# Altium footprint library goldpin_pcb.PcbLib: 235 footprints (part 8 of 15)
Each footprint in its own frame and in the unit in brackets; x right, y up, seen from the top. Pads: shape width x height; smd on the part's side, far side on the other; paste and mask are expansions set on the pad; w line width, h text height; cw(c..) or ccw(c..) is an arc to the next point about the centre after c.
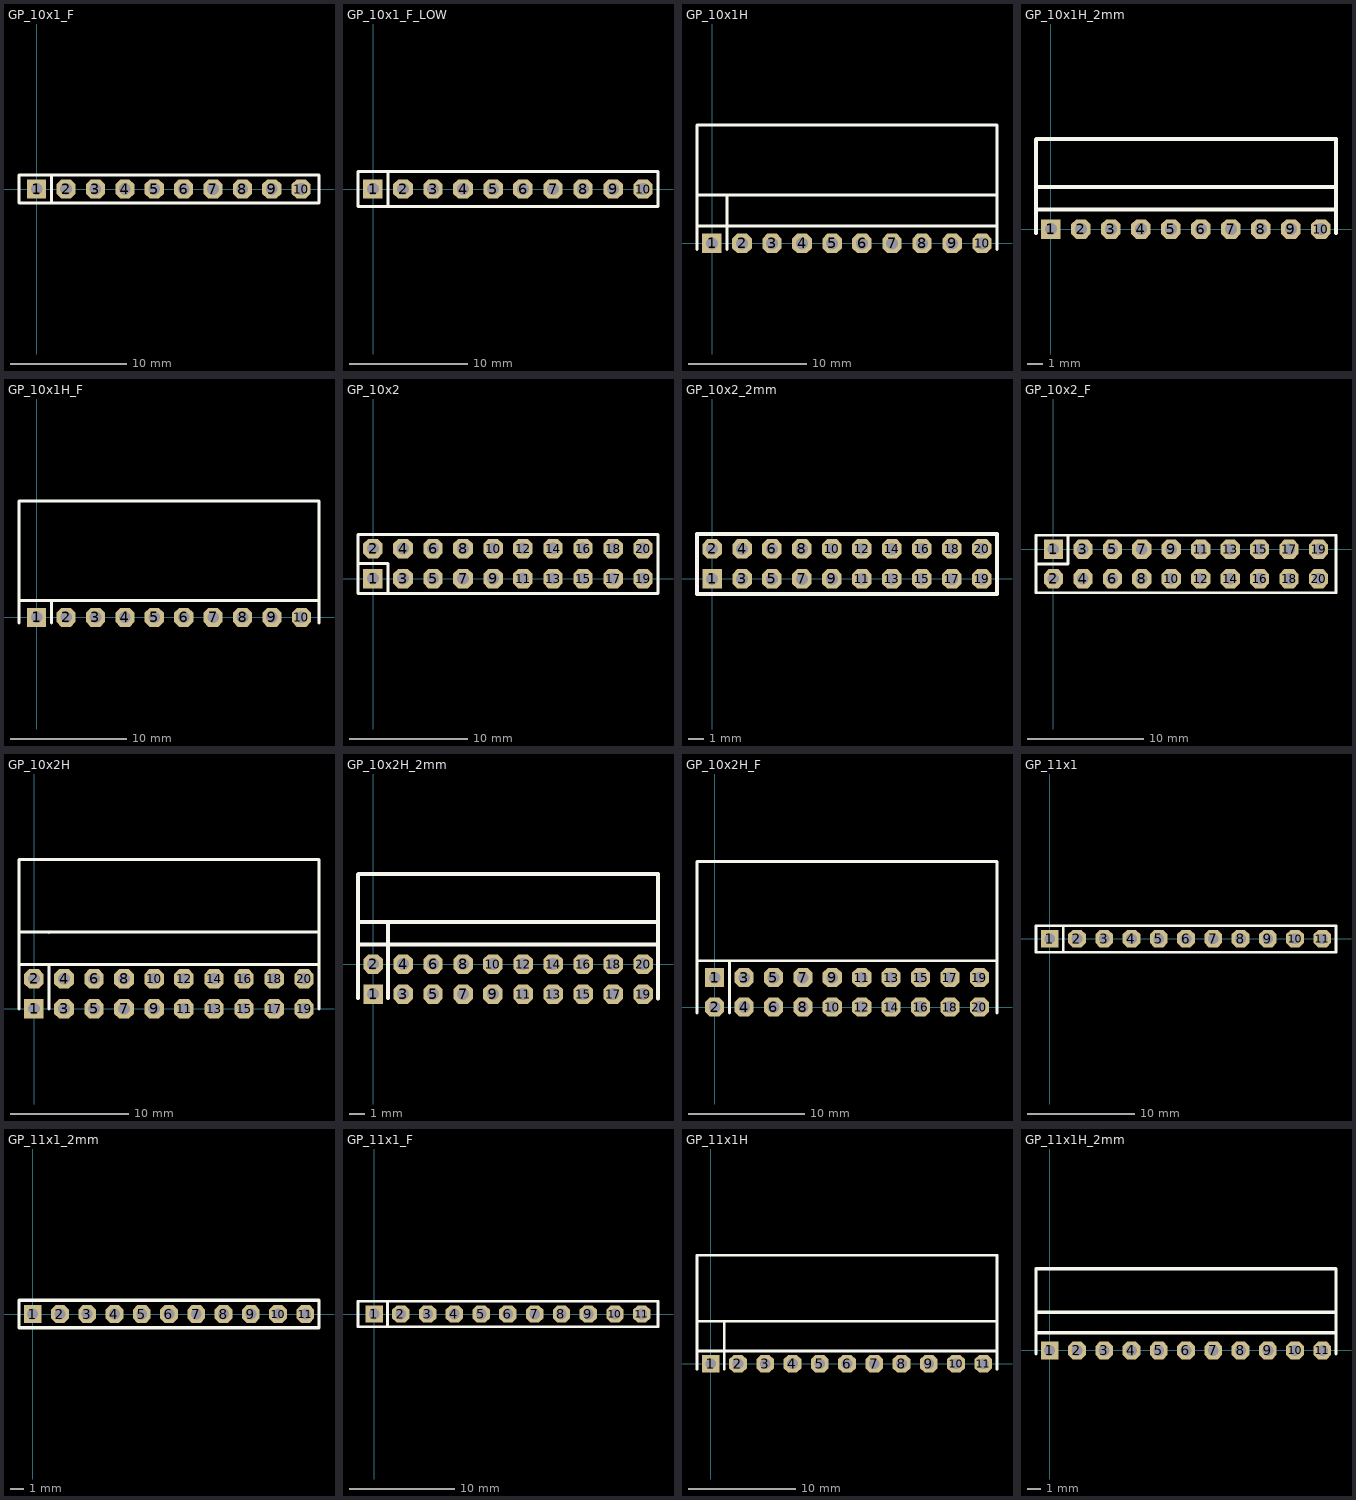
[diagram p7: the footprints below, top view; thin cyan lines are the x and y axes]

## GP_10x1_F [mil]
pads (10):
  rect 65x65 hole 39.37: 1(0,0)
  oct 65x65 hole 39.37: 2(100,0) 3(200,0) 4(300,0) 5(400,0) 6(500,0) 7(600,0) 8(700,0) 9(800,0) 10(900,0)
Top Overlay:
  lines w10: 50,-47.24 50,45 ; -60,-47.24 960.63,-47.24 960.63,47.24 -60,47.24 -60,-47.24
3D body: height 335, standoff -104, extent -60,-47.49 960,47.51

## GP_10x1_F_LOW [mil]
pads (10):
  rect 65x65 hole 39.37: 1(0,0)
  oct 65x65 hole 39.37: 2(100,0) 3(200,0) 4(300,0) 5(400,0) 6(500,0) 7(600,0) 8(700,0) 9(800,0) 10(900,0)
Top Overlay:
  lines w10: 50,-59.06 50,59.06 ; -50,-59.06 950,-59.06 950,59.06 -50,59.06 -50,-59.06
3D body: height 200.79, standoff -127.21, extent -51.18,-61.97 948.82,58.03

## GP_10x1H [mil]
pads (10):
  rect 65x65 hole 39.37: 1(0,0)
  oct 65x65 hole 39.37: 2(100,0) 3(200,0) 4(300,0) 5(400,0) 6(500,0) 7(600,0) 8(700,0) 9(800,0) 10(900,0)
Top Overlay:
  lines w10: -50,-19.68 -50,80.31 -50,395 950,395 950,-19.68 ; -50,57.24 950,57.24 ; -50,160.51 950,160.51 ; 50,-19.68 50,80.31 50,160.51
3D body: height 120, standoff -90, extent -50,-10 950,392.5

## GP_10x1H_2mm [mm]
height 4.45
pads (10):
  rect 1.3x1.3 hole 0.8: 1(0,0)
  oct 1.3x1.3 hole 0.8: 2(2,0) 3(4,0) 4(6,0) 5(8,0) 6(10,0) 7(12,0) 8(14,0) 9(16,0) 10(18,0)
Top Overlay:
  lines w0.254: -1,-0.25 -1,1.822 -1,5.973 ; -1,1.3 19,1.3 ; -1,2.8 19,2.8
  lines w0.256: -1,5.973 -0.973,6 19,6 19,-0.25
3D body: height 1.99, standoff -3.04, extent -1,-0.25 19,5.973

## GP_10x1H_F [mil]
pads (10):
  rect 65x65 hole 39.37: 1(0,0)
  oct 65x65 hole 39.37: 2(100,0) 3(200,0) 4(300,0) 5(400,0) 6(500,0) 7(600,0) 8(700,0) 9(800,0) 10(900,0)
Top Overlay:
  lines w10: -60,-20 -60,395 960,395 960,-20 ; -60,57.24 960,57.24 ; 50,-19.68 50,57.24
3D body: height 96.71, standoff -98.29, extent -60,-10 960,393

## GP_10x2 [mil]
pads (20):
  rect 65x65 hole 39.37: 1(0,0)
  oct 65x65 hole 39.37: 2(0,100) 3(100,0) 4(100,100) 5(200,0) 6(200,100) 7(300,0) 8(300,100) 9(400,0) 10(400,100) 11(500,0) 12(500,100) 13(600,0) 14(600,100) 15(700,0) 16(700,100) 17(800,0) 18(800,100) 19(900,0) 20(900,100)
Top Overlay:
  lines w10: -50,50 50,50 50,-50 ; -50,-50 950,-50 950,147.24 -50,147.24 -50,-50
3D body: height 330, standoff -115, extent -50,-50 950,150

## GP_10x2_2mm [mm]
height 4.45
pads (20):
  rect 1.3x1.3 hole 0.8: 1(0,0)
  oct 1.3x1.3 hole 0.8: 2(0,2) 3(2,0) 4(2,2) 5(4,0) 6(4,2) 7(6,0) 8(6,2) 9(8,0) 10(8,2) 11(10,0) 12(10,2) 13(12,0) 14(12,2) 15(14,0) 16(14,2) 17(16,0) 18(16,2) 19(18,0) 20(18,2)
Top Overlay:
  lines w0.254: -1,-1 -1,2.999 19,2.999 19,-1 -1,-1
3D body: height 6.51, standoff -1.69, extent -1,-0.968 19,2.969

## GP_10x2_F [mil]
pads (20):
  rect 65x65 hole 39.37: 1(0,0)
  oct 65x65 hole 39.37: 2(0,-100) 3(100,0) 4(100,-100) 5(200,0) 6(200,-100) 7(300,0) 8(300,-100) 9(400,0) 10(400,-100) 11(500,0) 12(500,-100) 13(600,0) 14(600,-100) 15(700,0) 16(700,-100) 17(800,0) 18(800,-100) 19(900,0) 20(900,-100)
Top Overlay:
  lines w10: -59.06,-50 50,-50 50,47.51 ; -59.06,-147.49 959.06,-147.49 959.06,47.49 -59.06,47.51 -59.06,-147.49
3D body: height 335, standoff -104, extent -60,-147.49 960,47.51

## GP_10x2H [mil]
pads (20):
  rect 65x65 hole 39.37: 1(0,0)
  oct 65x65 hole 39.37: 2(0,100) 3(100,0) 4(100,100) 5(200,0) 6(200,100) 7(300,0) 8(300,100) 9(400,0) 10(400,100) 11(500,0) 12(500,100) 13(600,0) 14(600,100) 15(700,0) 16(700,100) 17(800,0) 18(800,100) 19(900,0) 20(900,100)
Top Overlay:
  lines w10: -50,0 -50,180.31 -50,497.64 950,497.64 950,0 ; -50,147.24 950,147.24 ; -50,255.51 950,255.51 ; 49.21,255.51 50,254.72 ; 50,0 50,147.24
3D body: height 220, standoff -90, extent -50,-10 950,492.5

## GP_10x2H_2mm [mm]
height 4.45
pads (20):
  rect 1.3x1.3 hole 0.8: 1(0,-2)
  oct 1.3x1.3 hole 0.8: 2(0,0) 3(2,-2) 4(2,0) 5(4,-2) 6(4,0) 7(6,-2) 8(6,0) 9(8,-2) 10(8,0) 11(10,-2) 12(10,0) 13(12,-2) 14(12,0) 15(14,-2) 16(14,0) 17(16,-2) 18(16,0) 19(18,-2) 20(18,0)
Top Overlay:
  lines w0.254: -1,-2.275 -1,1.822 -1,5.973 ; -1,1.3 19,1.3 ; -1,2.8 19,2.8 ; 0.99,-2.275 0.99,2.775 ; 19,-2.3 19,6
  lines w0.256: -1,5.973 -0.973,6 19,6
3D body: height 3.97, standoff -3.02, extent -1.025,-2.261 18.975,5.961

## GP_10x2H_F [mil]
pads (20):
  rect 65x65 hole 39.37: 1(0,100)
  oct 65x65 hole 39.37: 2(0,0) 3(100,100) 4(100,0) 5(200,100) 6(200,0) 7(300,100) 8(300,0) 9(400,100) 10(400,0) 11(500,100) 12(500,0) 13(600,100) 14(600,0) 15(700,100) 16(700,0) 17(800,100) 18(800,0) 19(900,100) 20(900,0)
Top Overlay:
  lines w10: -60,-20 -60,495 960,495 960,-20 ; -60,157.24 960,157.24 ; 50,-20 50,157.24
3D body: height 197.89, standoff -97.11, extent -59.06,-11.81 960.94,491.19

## GP_11x1 [mil]
pads (11):
  rect 65x65 hole 39.37: 1(0,0)
  oct 65x65 hole 39.37: 2(100,0) 3(200,0) 4(300,0) 5(400,0) 6(500,0) 7(600,0) 8(700,0) 9(800,0) 10(900,0) 11(1000,0)
Top Overlay:
  lines w10: 50,-50 50,47.24 ; -50,-50 -50,47.24 1050,47.24 1050,-50 -50,-50
3D body: height 330, standoff -115, extent -50,-50 1050,50

## GP_11x1_2mm [mm]
height 4.45
pads (11):
  rect 1.3x1.3 hole 0.8: 1(0,0)
  oct 1.3x1.3 hole 0.8: 2(2,0) 3(4,0) 4(6,0) 5(8,0) 6(10,0) 7(12,0) 8(14,0) 9(16,0) 10(18,0) 11(20,0)
Top Overlay:
  lines w0.254: -1,-1 21,-1 21,1 -1,1 -1,-1
3D body: height 5.51, standoff -2.69, extent -1,-0.99 21,0.991

## GP_11x1_F [mil]
pads (11):
  rect 65x65 hole 39.37: 1(0,0)
  oct 65x65 hole 39.37: 2(100,0) 3(200,0) 4(300,0) 5(400,0) 6(500,0) 7(600,0) 8(700,0) 9(800,0) 10(900,0) 11(1000,0)
Top Overlay:
  lines w10: 50,-47.24 50,45 ; -60,-47.24 -60,47.24 1060.63,47.24 1060.63,-47.24 -60,-47.24
3D body: height 335, standoff -104, extent -60,-47.5 1060,47.5

## GP_11x1H [mil]
pads (11):
  rect 65x65 hole 39.37: 1(0,0)
  oct 65x65 hole 39.37: 2(100,0) 3(200,0) 4(300,0) 5(400,0) 6(500,0) 7(600,0) 8(700,0) 9(800,0) 10(900,0) 11(1000,0)
Top Overlay:
  lines w10: -50,-19.68 -50,80.31 -50,397.64 1050,397.64 1050,-19.68 ; -50,47.24 1050,47.24 ; -50,155.51 1050,155.51 ; 49.21,155.51 50,154.72 50,80.31 50,-19.68
3D body: height 120, standoff -90, extent -50,-10 1050,392.5

## GP_11x1H_2mm [mm]
height 4.45
pads (11):
  rect 1.3x1.3 hole 0.8: 1(0,0)
  oct 1.3x1.3 hole 0.8: 2(2,0) 3(4,0) 4(6,0) 5(8,0) 6(10,0) 7(12,0) 8(14,0) 9(16,0) 10(18,0) 11(20,0)
Top Overlay:
  lines w0.254: -1,-0.25 -1,1.822 -1,5.973 ; -1,1.3 21,1.3 ; -1,2.8 21,2.8
  lines w0.256: -1,5.973 -0.973,6 21,6 21,-0.25
3D body: height 1.99, standoff -3.04, extent -1,-0.25 21,5.973